# Altium footprint library PCB贴片元件封装库.pcblib: 366 footprints (part 21 of 23)
Each footprint in its own frame and in the unit in brackets; x right, y up, seen from the top. Pads: shape width x height; smd on the part's side, far side on the other; paste and mask are expansions set on the pad; w line width, h text height; cw(c..) or ccw(c..) is an arc to the next point about the centre after c.
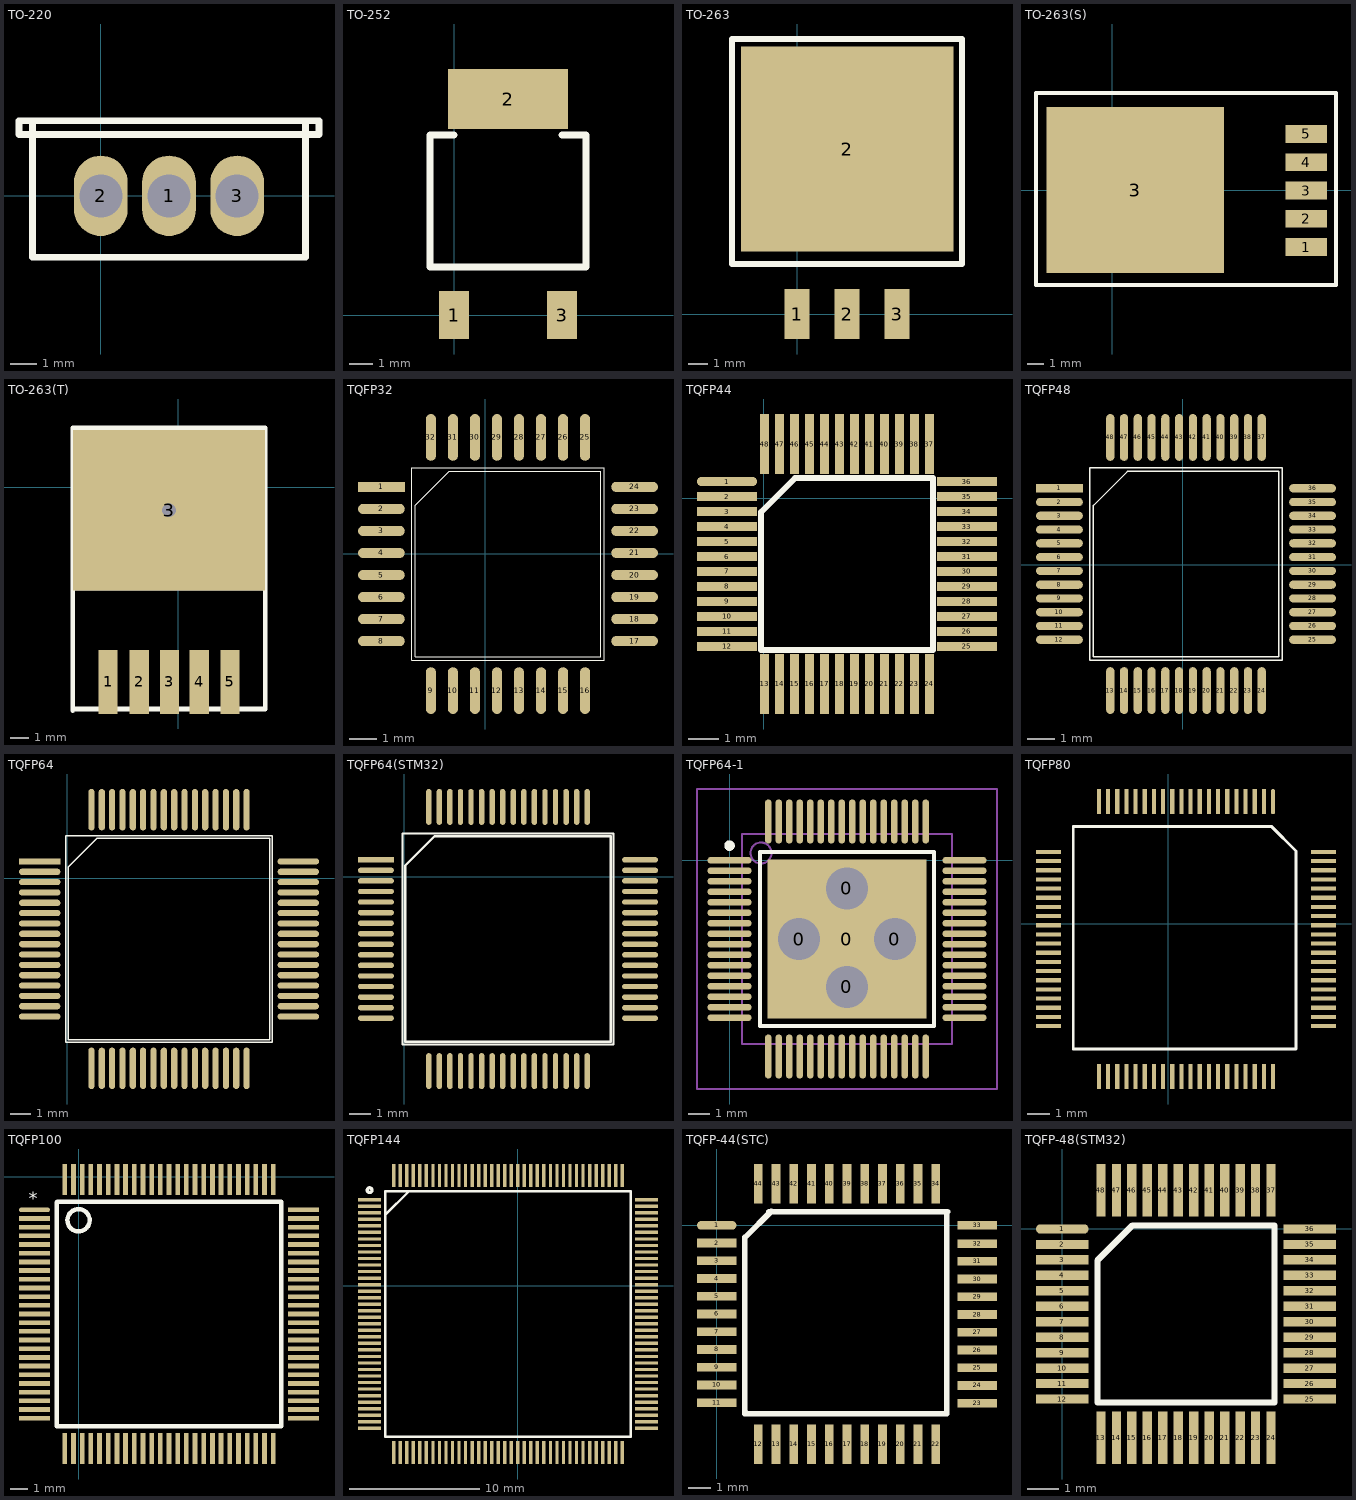
[diagram p20: the footprints below, top view; thin cyan lines are the x and y axes]

## TO-220 [mm]
pads (3):
  oval 2x3 hole 1.6: 1(2.54,0) 2(0,0) 3(5.08,0)
TopOverlay:
  lines w0.254: -2.54,2.794 7.62,2.794 ; -2.54,2.794 -2.54,-2.286 7.62,-2.286 7.62,2.794 ; -2.54,2.794 -3.048,2.794 -3.048,2.286 -2.54,2.286 7.62,2.286 8.128,2.286 8.128,2.794 7.62,2.794

## TO-252 [mil]
pads (3):
  rect 50x80 smd: 1(0,0) 3(180,0)
  rect 200x100 smd: 2(90,360)
TopOverlay:
  lines w11.81: -40,80 -40,300 0,300 ; 180,300 220,300 220,80
  lines w12: -40,80 220,80

## TO-263 [mil]
pads (4):
  rect 50x100 smd: 1(0,0) 2(100,0) 3(200,0)
  rect 425x410 smd: 2(100,330)
TopOverlay:
  lines w11.81: -130,100 -130,550 330,550 330,100 -130,100

## TO-263(S) [mm]
pads (6):
  rect 2.5x1.07 smd: 1(11.684,-3.429) 2(11.684,-1.729) 3(11.684,-0.029) 4(11.684,1.671) 5(11.684,3.371)
  rect 10.67x10 smd: 3(1.397,0)
TopOverlay:
  lines w0.254: -4.572,-5.715 -4.572,5.842 -4.191,5.842 -3.81,5.842 -3.048,5.842 -2.413,5.842 -2.032,5.842 13.462,5.842 13.462,-5.715 -2.413,-5.715 -3.048,-5.715 -3.81,-5.715 -4.191,-5.715 -4.572,-5.715

## TO-263(T) [mil]
pads (6):
  rect 42x140 smd: 1(-153,-425) 2(-85,-425) 3(-19,-425) 4(46,-425) 5(113,-425)
  rect 420x350 hole 30: 3(-20,-50)
TopOverlay:
  lines w10: -230,-488 -230,130 190,130 190,-485 ; -230,-484 190,-484 ; -230,-220 190,-220

## TQFP32 [mm]
pads (32):
  rect 1.7x0.37 smd: 1(-3.781,2.422)
  oval 1.7x0.37 smd: 2(-3.781,1.622) 3(-3.781,0.822) 4(-3.781,0.022) 5(-3.781,-0.778) 6(-3.781,-1.578) 7(-3.781,-2.378) 8(-3.781,-3.178) 17(5.419,-3.178) 18(5.419,-2.378) 19(5.419,-1.578) 20(5.419,-0.778) 21(5.419,0.022) 22(5.419,0.822) 23(5.419,1.622) 24(5.419,2.422)
  oval 0.37x1.7 smd: 9(-1.981,-4.978) 10(-1.181,-4.978) 11(-0.381,-4.978) 12(0.419,-4.978) 13(1.219,-4.978) 14(2.019,-4.978) 15(2.819,-4.978) 16(3.619,-4.978) 25(3.619,4.222) 26(2.819,4.222) 27(2.019,4.222) 28(1.219,4.222) 29(0.419,4.222) 30(-0.381,4.222) 31(-1.181,4.222) 32(-1.981,4.222)
TopOverlay:
  lines w0.025: -2.681,-3.878 4.319,-3.878 4.319,3.122 -2.681,3.122 -2.681,-0.378 -2.681,-3.878 ; -2.546,-3.743 -2.546,1.752 -1.311,2.987 4.184,2.987 4.184,-3.743 -2.546,-3.743

## TQFP44 [mm]
pads (48):
  oval 2x0.3 smd: 1(-1.219,0.559)
  rect 2x0.3 smd: 2(-1.219,0.059) 3(-1.219,-0.441) 4(-1.219,-0.941) 5(-1.219,-1.441) 6(-1.219,-1.941) 7(-1.219,-2.441) 8(-1.219,-2.941) 9(-1.219,-3.441) 10(-1.219,-3.941) 11(-1.219,-4.441) 12(-1.219,-4.941) 25(6.781,-4.941) 26(6.781,-4.441) 27(6.781,-3.941) 28(6.781,-3.441) 29(6.781,-2.941) 30(6.781,-2.441) 31(6.781,-1.941) 32(6.781,-1.441) 33(6.781,-0.941) 34(6.781,-0.441) 35(6.781,0.059) 36(6.781,0.559)
  rect 0.3x2 smd: 13(0.031,-6.191) 14(0.531,-6.191) 15(1.031,-6.191) 16(1.531,-6.191) 17(2.031,-6.191) 18(2.531,-6.191) 19(3.031,-6.191) 20(3.531,-6.191) 21(4.031,-6.191) 22(4.531,-6.191) 23(5.031,-6.191) 24(5.531,-6.191) 37(5.531,1.809) 38(5.031,1.809) 39(4.531,1.809) 40(4.031,1.809) 41(3.531,1.809) 42(3.031,1.809) 43(2.531,1.809) 44(2.031,1.809) 45(1.531,1.809) 46(1.031,1.809) 47(0.531,1.809) 48(0.031,1.809)
TopOverlay:
  lines w0.2: -0.084,-5.056 -0.084,-0.461 1.051,0.674 5.646,0.674 5.646,-5.056 -0.084,-5.056

## TQFP48 [mm]
pads (48):
  rect 1.7x0.3 smd: 1(-4.482,2.784)
  oval 1.7x0.3 smd: 2(-4.482,2.284) 3(-4.482,1.784) 4(-4.482,1.284) 5(-4.482,0.784) 6(-4.482,0.284) 7(-4.482,-0.216) 8(-4.482,-0.716) 9(-4.482,-1.216) 10(-4.482,-1.716) 11(-4.482,-2.216) 12(-4.482,-2.716) 25(4.718,-2.716) 26(4.718,-2.216) 27(4.718,-1.716) 28(4.718,-1.216) 29(4.718,-0.716) 30(4.718,-0.216) 31(4.718,0.284) 32(4.718,0.784) 33(4.718,1.284) 34(4.718,1.784) 35(4.718,2.284) 36(4.718,2.784)
  oval 0.3x1.7 smd: 13(-2.632,-4.566) 14(-2.132,-4.566) 15(-1.632,-4.566) 16(-1.132,-4.566) 17(-0.632,-4.566) 18(-0.132,-4.566) 19(0.368,-4.566) 20(0.868,-4.566) 21(1.368,-4.566) 22(1.868,-4.566) 23(2.368,-4.566) 24(2.868,-4.566) 37(2.868,4.634) 38(2.368,4.634) 39(1.868,4.634) 40(1.368,4.634) 41(0.868,4.634) 42(0.368,4.634) 43(-0.132,4.634) 44(-0.632,4.634) 45(-1.132,4.634) 46(-1.632,4.634) 47(-2.132,4.634) 48(-2.632,4.634)
TopOverlay:
  lines w0.055: -3.382,-3.466 -3.382,0.034 -3.382,3.459 -3.382,3.534 3.618,3.534 3.618,-3.466 -3.382,-3.466 ; -3.247,-3.331 3.483,-3.331 3.483,3.399 -2.012,3.399 -3.247,2.164 -3.247,-3.331

## TQFP64 [mm]
pads (64):
  rect 2x0.3 smd: 1(-1.338,0.809)
  oval 2x0.3 smd: 2(-1.338,0.309) 3(-1.338,-0.191) 4(-1.338,-0.691) 5(-1.338,-1.191) 6(-1.338,-1.691) 7(-1.338,-2.191) 8(-1.338,-2.691) 9(-1.338,-3.191) 10(-1.338,-3.691) 11(-1.338,-4.191) 12(-1.338,-4.691) 13(-1.338,-5.191) 14(-1.338,-5.691) 15(-1.338,-6.191) 16(-1.338,-6.691) 33(11.162,-6.691) 34(11.162,-6.191) 35(11.162,-5.691) 36(11.162,-5.191) 37(11.162,-4.691) 38(11.162,-4.191) 39(11.162,-3.691) 40(11.162,-3.191) 41(11.162,-2.691) 42(11.162,-2.191) 43(11.162,-1.691) 44(11.162,-1.191) 45(11.162,-0.691) 46(11.162,-0.191) 47(11.162,0.309) 48(11.162,0.809)
  oval 0.3x2 smd: 17(1.162,-9.191) 18(1.662,-9.191) 19(2.162,-9.191) 20(2.662,-9.191) 21(3.162,-9.191) 22(3.662,-9.191) 23(4.162,-9.191) 24(4.662,-9.191) 25(5.162,-9.191) 26(5.662,-9.191) 27(6.162,-9.191) 28(6.662,-9.191) 29(7.162,-9.191) 30(7.662,-9.191) 31(8.162,-9.191) 32(8.662,-9.191) 49(8.662,3.309) 50(8.162,3.309) 51(7.662,3.309) 52(7.162,3.309) 53(6.662,3.309) 54(6.162,3.309) 55(5.662,3.309) 56(5.162,3.309) 57(4.662,3.309) 58(4.162,3.309) 59(3.662,3.309) 60(3.162,3.309) 61(2.662,3.309) 62(2.162,3.309) 63(1.662,3.309) 64(1.162,3.309)
TopOverlay:
  lines w0.076: -0.088,-7.941 -0.088,-2.941 -0.088,2.059 9.912,2.059 9.912,-7.941 -0.088,-7.941 ; 0.047,-7.806 0.047,0.539 1.432,1.924 9.777,1.924 9.777,-7.806 0.047,-7.806

## TQFP64(STM32) [mil]
pads (64):
  rect 66.93x10 smd: 1(-52.68,31.85)
  oval 66.93x10 smd: 2(-52.68,12.17) 3(-52.68,-7.52) 4(-52.68,-27.21) 5(-52.68,-46.89) 6(-52.68,-66.58) 7(-52.68,-86.26) 8(-52.68,-105.95) 9(-52.68,-125.63) 10(-52.68,-145.32) 11(-52.68,-165) 12(-52.68,-184.69) 13(-52.68,-204.37) 14(-52.68,-224.05) 15(-52.68,-243.74) 16(-52.68,-263.42) 33(439.45,-263.42) 34(439.45,-243.74) 35(439.45,-224.05) 36(439.45,-204.37) 37(439.45,-184.69) 38(439.45,-165) 39(439.45,-145.32) 40(439.45,-125.63) 41(439.45,-105.95) 42(439.45,-86.26) 43(439.45,-66.57) 44(439.45,-46.89) 45(439.45,-27.2) 46(439.45,-7.52) 47(439.45,12.17) 48(439.45,31.85)
  oval 10x66.93 smd: 17(45.75,-361.85) 18(65.43,-361.85) 19(85.12,-361.85) 20(104.8,-361.85) 21(124.49,-361.85) 22(144.17,-361.85) 23(163.86,-361.85) 24(183.54,-361.85) 25(203.23,-361.85) 26(222.91,-361.85) 27(242.6,-361.85) 28(262.28,-361.85) 29(281.97,-361.85) 30(301.65,-361.85) 31(321.34,-361.85) 32(341.02,-361.85) 49(341.02,130.27) 50(321.34,130.27) 51(301.65,130.27) 52(281.97,130.27) 53(262.28,130.27) 54(242.6,130.27) 55(222.91,130.27) 56(203.23,130.27) 57(183.54,130.27) 58(163.86,130.27) 59(144.17,130.27) 60(124.49,130.27) 61(104.8,130.27) 62(85.12,130.27) 63(65.43,130.27) 64(45.75,130.27)
TopOverlay:
  lines w4: -3.46,-312.64 -3.46,-115.79 -3.46,81.06 390.24,81.06 390.24,-312.64 -3.46,-312.64 ; 1.85,-307.32 1.85,21.22 56.38,75.75 384.92,75.75 384.92,-307.32 1.85,-307.32

## TQFP64-1 [mm]
pads (69):
  round 2.5 hole 2: 0(3.314,-3.75) 0(5.6,-6.036) 0(5.6,-1.337) 0(7.886,-3.75)
  rect 7.57x7.57 smd: 0(5.6,-3.75)
  oval 2.1x0.31 smd: 1(0,0) 2(0,-0.5) 3(0,-1) 4(0,-1.5) 5(0,-2) 6(0,-2.5) 7(0,-3) 8(0,-3.5) 9(0,-4) 10(0,-4.5) 11(0,-5) 12(0,-5.5) 13(0,-6) 14(0,-6.5) 15(0,-7) 16(0,-7.5) 33(11.2,-7.5) 34(11.2,-7) 35(11.2,-6.5) 36(11.2,-6) 37(11.2,-5.5) 38(11.2,-5) 39(11.2,-4.5) 40(11.2,-4) 41(11.2,-3.5) 42(11.2,-3) 43(11.2,-2.5) 44(11.2,-2) 45(11.2,-1.5) 46(11.2,-1) 47(11.2,-0.5) 48(11.2,0)
  oval 0.31x2.1 smd: 17(1.85,-9.35) 18(2.35,-9.35) 19(2.85,-9.35) 20(3.35,-9.35) 21(3.85,-9.35) 22(4.35,-9.35) 23(4.85,-9.35) 24(5.35,-9.35) 25(5.85,-9.35) 26(6.35,-9.35) 27(6.85,-9.35) 28(7.35,-9.35) 29(7.85,-9.35) 30(8.35,-9.35) 31(8.85,-9.35) 32(9.35,-9.35) 49(9.35,1.85) 50(8.85,1.85) 51(8.35,1.85) 52(7.85,1.85) 53(7.35,1.85) 54(6.85,1.85) 55(6.35,1.85) 56(5.85,1.85) 57(5.35,1.85) 58(4.85,1.85) 59(4.35,1.85) 60(3.85,1.85) 61(3.35,1.85) 62(2.85,1.85) 63(2.35,1.85) 64(1.85,1.85)
TopOverlay:
  circle w0.6: c2.45,-0.6 r0.3
  circle w0.25: c0,0.7 r0.125
  lines w0.2: 1.45,-7.9 9.75,-7.9 9.75,0.4 1.45,0.4 1.45,-7.9
Mechanical13:
  circle w0.1: c1.5,0.35 r0.5
  lines w0.1: 0.6,-8.75 10.6,-8.75 10.6,1.25 0.6,1.25 0.6,-8.75
Mechanical15:
  lines w0.1: 5.1,-3.75 6.1,-3.75 ; 5.6,-4.25 5.6,-3.25 ; -1.55,-10.9 12.75,-10.9 12.75,3.4 -1.55,3.4 -1.55,-10.9

## TQFP80 [mm]
pads (80):
  oval 0.18x1.1 smd: 1(4.572,5.334)
  rect 0.18x1.1 smd: 2(4.172,5.334) 3(3.772,5.334) 4(3.372,5.334) 5(2.972,5.334) 6(2.572,5.334) 7(2.172,5.334) 8(1.772,5.334) 9(1.372,5.334) 10(0.972,5.334) 11(0.572,5.334) 12(0.172,5.334) 13(-0.228,5.334) 14(-0.628,5.334) 15(-1.028,5.334) 16(-1.428,5.334) 17(-1.828,5.334) 18(-2.228,5.334) 19(-2.628,5.334) 20(-3.028,5.334) 41(-3.028,-6.666) 42(-2.628,-6.666) 43(-2.228,-6.666) 44(-1.828,-6.666) 45(-1.428,-6.666) 46(-1.028,-6.666) 47(-0.628,-6.666) 48(-0.228,-6.666) 49(0.172,-6.666) 50(0.572,-6.666) 51(0.972,-6.666) 52(1.372,-6.666) 53(1.772,-6.666) 54(2.172,-6.666) 55(2.572,-6.666) 56(2.972,-6.666) 57(3.372,-6.666) 58(3.772,-6.666) 59(4.172,-6.666) 60(4.572,-6.666)
  rect 1.1x0.18 smd: 21(-5.228,3.134) 22(-5.228,2.734) 23(-5.228,2.334) 24(-5.228,1.934) 25(-5.228,1.534) 26(-5.228,1.134) 27(-5.228,0.734) 28(-5.228,0.334) 29(-5.228,-0.066) 30(-5.228,-0.466) 31(-5.228,-0.866) 32(-5.228,-1.266) 33(-5.228,-1.666) 34(-5.228,-2.066) 35(-5.228,-2.466) 36(-5.228,-2.866) 37(-5.228,-3.266) 38(-5.228,-3.666) 39(-5.228,-4.066) 40(-5.228,-4.466) 61(6.772,-4.466) 62(6.772,-4.066) 63(6.772,-3.666) 64(6.772,-3.266) 65(6.772,-2.866) 66(6.772,-2.466) 67(6.772,-2.066) 68(6.772,-1.666) 69(6.772,-1.266) 70(6.772,-0.866) 71(6.772,-0.466) 72(6.772,-0.066) 73(6.772,0.334) 74(6.772,0.734) 75(6.772,1.134) 76(6.772,1.534) 77(6.772,1.934) 78(6.772,2.334) 79(6.772,2.734) 80(6.772,3.134)
TopOverlay:
  lines w0.127: -4.153,-5.474 -4.153,4.255 4.496,4.255 5.575,3.175 5.575,-5.474 -4.153,-5.474

## TQFP100 [mm]
pads (100):
  oval 1.778x0.27 smd: 1(-2.54,-1.905)
  rect 1.778x0.27 smd: 2(-2.54,-2.405) 3(-2.54,-2.905) 4(-2.54,-3.405) 5(-2.54,-3.905) 6(-2.54,-4.405) 7(-2.54,-4.905) 8(-2.54,-5.405) 9(-2.54,-5.905) 10(-2.54,-6.405) 11(-2.54,-6.905) 12(-2.54,-7.405) 13(-2.54,-7.905) 14(-2.54,-8.405) 15(-2.54,-8.905) 16(-2.54,-9.405) 17(-2.54,-9.905) 18(-2.54,-10.405) 19(-2.54,-10.905) 20(-2.54,-11.405) 21(-2.54,-11.905) 22(-2.54,-12.405) 23(-2.54,-12.905) 24(-2.54,-13.405) 25(-2.54,-13.905) 51(12.96,-13.905) 52(12.96,-13.405) 53(12.96,-12.905) 54(12.96,-12.405) 55(12.96,-11.905) 56(12.96,-11.405) 57(12.96,-10.905) 58(12.96,-10.405) 59(12.96,-9.905) 60(12.96,-9.405) 61(12.96,-8.905) 62(12.96,-8.405) 63(12.96,-7.905) 64(12.96,-7.405) 65(12.96,-6.905) 66(12.96,-6.405) 67(12.96,-5.905) 68(12.96,-5.405) 69(12.96,-4.905) 70(12.96,-4.405) 71(12.96,-3.905) 72(12.96,-3.405) 73(12.96,-2.905) 74(12.96,-2.405) 75(12.96,-1.905)
  rect 0.27x1.778 smd: 26(-0.79,-15.655) 27(-0.29,-15.655) 28(0.21,-15.655) 29(0.71,-15.655) 30(1.21,-15.655) 31(1.71,-15.655) 32(2.21,-15.655) 33(2.71,-15.655) 34(3.21,-15.655) 35(3.71,-15.655) 36(4.21,-15.655) 37(4.71,-15.655) 38(5.21,-15.655) 39(5.71,-15.655) 40(6.21,-15.655) 41(6.71,-15.655) 42(7.21,-15.655) 43(7.71,-15.655) 44(8.21,-15.655) 45(8.71,-15.655) 46(9.21,-15.655) 47(9.71,-15.655) 48(10.21,-15.655) 49(10.71,-15.655) 50(11.21,-15.655) 76(11.21,-0.155) 77(10.71,-0.155) 78(10.21,-0.155) 79(9.71,-0.155) 80(9.21,-0.155) 81(8.71,-0.155) 82(8.21,-0.155) 83(7.71,-0.155) 84(7.21,-0.155) 85(6.71,-0.155) 86(6.21,-0.155) 87(5.71,-0.155) 88(5.21,-0.155) 89(4.71,-0.155) 90(4.21,-0.155) 91(3.71,-0.155) 92(3.21,-0.155) 93(2.71,-0.155) 94(2.21,-0.155) 95(1.71,-0.155) 96(1.21,-0.155) 97(0.71,-0.155) 98(0.21,-0.155) 99(-0.29,-0.155) 100(-0.79,-0.155)
TopOverlay:
  lines w0.254: -1.255,-2.769 -1.255,-1.463 -1.232,-1.44 0.432,-1.44 ; -1.255,-2.725 -1.255,-14.37 11.675,-14.37 11.675,-1.44 0.03,-1.44 ; 0.632,-2.394 ccw(c0.001,-2.507) 0.635,-2.413
  text "*" at -2.87,-1.6 h0.76

## TQFP144 [mil]
pads (144):
  rect 70x10 smd: 1(-446.38,259.96) 2(-446.38,240.28) 3(-446.38,220.59) 4(-446.38,200.91) 5(-446.38,181.22) 6(-446.38,161.54) 7(-446.38,141.85) 8(-446.38,122.17) 9(-446.38,102.48) 10(-446.38,82.8) 11(-446.38,63.11) 12(-446.38,43.43) 13(-446.38,23.74) 14(-446.38,4.06) 15(-446.38,-15.63) 16(-446.38,-35.32) 17(-446.38,-55) 18(-446.38,-74.69) 19(-446.38,-94.37) 20(-446.38,-114.06) 21(-446.38,-133.74) 22(-446.38,-153.43) 23(-446.38,-173.11) 24(-446.38,-192.8) 25(-446.38,-212.48) 26(-446.38,-232.17) 27(-446.38,-251.85) 28(-446.38,-271.54) 29(-446.38,-291.22) 30(-446.38,-310.91) 31(-446.38,-330.59) 32(-446.38,-350.28) 33(-446.38,-369.96) 34(-446.38,-389.65) 35(-446.38,-409.33) 36(-446.38,-429.02) 73(388.27,-429.02) 74(388.27,-409.33) 75(388.27,-389.65) 76(388.27,-369.96) 77(388.27,-350.28) 78(388.27,-330.59) 79(388.27,-310.91) 80(388.27,-291.22) 81(388.27,-271.54) 82(388.27,-251.85) 83(388.27,-232.17) 84(388.27,-212.48) 85(388.27,-192.8) 86(388.27,-173.11) 87(388.27,-153.43) 88(388.27,-133.74) 89(388.27,-114.06) 90(388.27,-94.37) 91(388.27,-74.69) 92(388.27,-55) 93(388.27,-35.32) 94(388.27,-15.63) 95(388.27,4.06) 96(388.27,23.74) 97(388.27,43.43) 98(388.27,63.11) 99(388.27,82.8) 100(388.27,102.48) 101(388.27,122.17) 102(388.27,141.85) 103(388.27,161.54) 104(388.27,181.22) 105(388.27,200.91) 106(388.27,220.59) 107(388.27,240.28) 108(388.27,259.96)
  rect 10x70 smd: 37(-373.54,-501.85) 38(-353.86,-501.85) 39(-334.17,-501.85) 40(-314.49,-501.85) 41(-294.8,-501.85) 42(-275.12,-501.85) 43(-255.43,-501.85) 44(-235.75,-501.85) 45(-216.06,-501.85) 46(-196.38,-501.85) 47(-176.69,-501.85) 48(-157.01,-501.85) 49(-137.32,-501.85) 50(-117.64,-501.85) 51(-97.95,-501.85) 52(-78.27,-501.85) 53(-58.58,-501.85) 54(-38.9,-501.85) 55(-19.21,-501.85) 56(0.47,-501.85) 57(20.16,-501.85) 58(39.84,-501.85) 59(59.53,-501.85) 60(79.21,-501.85) 61(98.9,-501.85) 62(118.58,-501.85) 63(138.27,-501.85) 64(157.95,-501.85) 65(177.64,-501.85) 66(197.32,-501.85) 67(217.01,-501.85) 68(236.69,-501.85) 69(256.38,-501.85) 70(276.06,-501.85) 71(295.75,-501.85) 72(315.43,-501.85) 109(315.43,332.8) 110(295.75,332.8) 111(276.06,332.8) 112(256.38,332.8) 113(236.69,332.8) 114(217.01,332.8) 115(197.32,332.8) 116(177.64,332.8) 117(157.95,332.8) 118(138.27,332.8) 119(118.58,332.8) 120(98.9,332.8) 121(79.21,332.8) 122(59.53,332.8) 123(39.84,332.8) 124(20.16,332.8) 125(0.47,332.8) 126(-19.21,332.8) 127(-38.9,332.8) 128(-58.58,332.8) 129(-78.27,332.8) 130(-97.95,332.8) 131(-117.64,332.8) 132(-137.32,332.8) 133(-157.01,332.8) 134(-176.69,332.8) 135(-196.38,332.8) 136(-216.06,332.8) 137(-235.75,332.8) 138(-255.43,332.8) 139(-275.12,332.8) 140(-294.8,332.8) 141(-314.49,332.8) 142(-334.17,332.8) 143(-353.86,332.8) 144(-373.54,332.8)
TopOverlay:
  circle w9.84: c-446.4,288.96 r7.02
  lines w7.8: -398.97,214.96 -328.38,285.55
  lines w7.87: -399.13,-454.61 341.02,-454.61 341.02,285.55 -399.13,285.55 -399.13,-454.61

## TQFP-44(STC) [mil]
pads (44):
  oval 70x15.55 smd: 1(0,0)
  rect 70x15.55 smd: 2(0,-31.5) 3(0,-62.99) 4(0,-94.49) 5(0,-125.98) 6(0,-157.48) 7(0,-188.98) 8(0,-220.47) 9(0,-251.97) 10(0,-283.46) 11(0,-314.96) 23(462.94,-315.96) 24(462.94,-284.46) 25(462.94,-252.97) 26(462.94,-221.47) 27(462.94,-189.98) 28(462.94,-158.48) 29(462.94,-126.98) 30(462.94,-95.49) 31(462.94,-63.99) 32(462.94,-32.5) 33(462.94,0)
  rect 15.55x70 smd: 12(74,-389) 13(105.5,-389) 14(136.99,-389) 15(168.49,-389) 16(199.98,-389) 17(231.48,-389) 18(262.98,-389) 19(294.47,-389) 20(325.97,-389) 21(357.46,-389) 22(388.96,-389) 34(388.96,74) 35(357.46,74) 36(325.97,74) 37(294.47,74) 38(262.98,74) 39(231.48,74) 40(199.98,74) 41(168.49,74) 42(136.99,74) 43(105.5,74) 44(74,74)
TopOverlay:
  lines w10: 50,-333 50,-21 ; 51,-21 97,25 ; 52,-333 50,-335 409,-335 409,23 410,24 93,24

## TQFP-48(STM32) [mm]
height 6.5
pads (48):
  oval 1.7x0.3 smd: 1(0,0)
  rect 1.7x0.3 smd: 2(0,-0.5) 3(0,-1) 4(0,-1.5) 5(0,-2) 6(0,-2.5) 7(0,-3) 8(0,-3.5) 9(0,-4) 10(0,-4.5) 11(0,-5) 12(0,-5.5) 25(8,-5.5) 26(8,-5) 27(8,-4.5) 28(8,-4) 29(8,-3.5) 30(8,-3) 31(8,-2.5) 32(8,-2) 33(8,-1.5) 34(8,-1) 35(8,-0.5) 36(8,0)
  rect 0.3x1.7 smd: 13(1.25,-6.75) 14(1.75,-6.75) 15(2.25,-6.75) 16(2.75,-6.75) 17(3.25,-6.75) 18(3.75,-6.75) 19(4.25,-6.75) 20(4.75,-6.75) 21(5.25,-6.75) 22(5.75,-6.75) 23(6.25,-6.75) 24(6.75,-6.75) 37(6.75,1.25) 38(6.25,1.25) 39(5.75,1.25) 40(5.25,1.25) 41(4.75,1.25) 42(4.25,1.25) 43(3.75,1.25) 44(3.25,1.25) 45(2.75,1.25) 46(2.25,1.25) 47(1.75,1.25) 48(1.25,1.25)
TopOverlay:
  lines w0.2: 1.135,-5.615 6.865,-5.615 6.865,0.115 2.27,0.115 1.135,-1.02 1.135,-5.615